# Altium integrated library Mylib Rev 4.IntLib: 207 symbols (part 2 of 3)
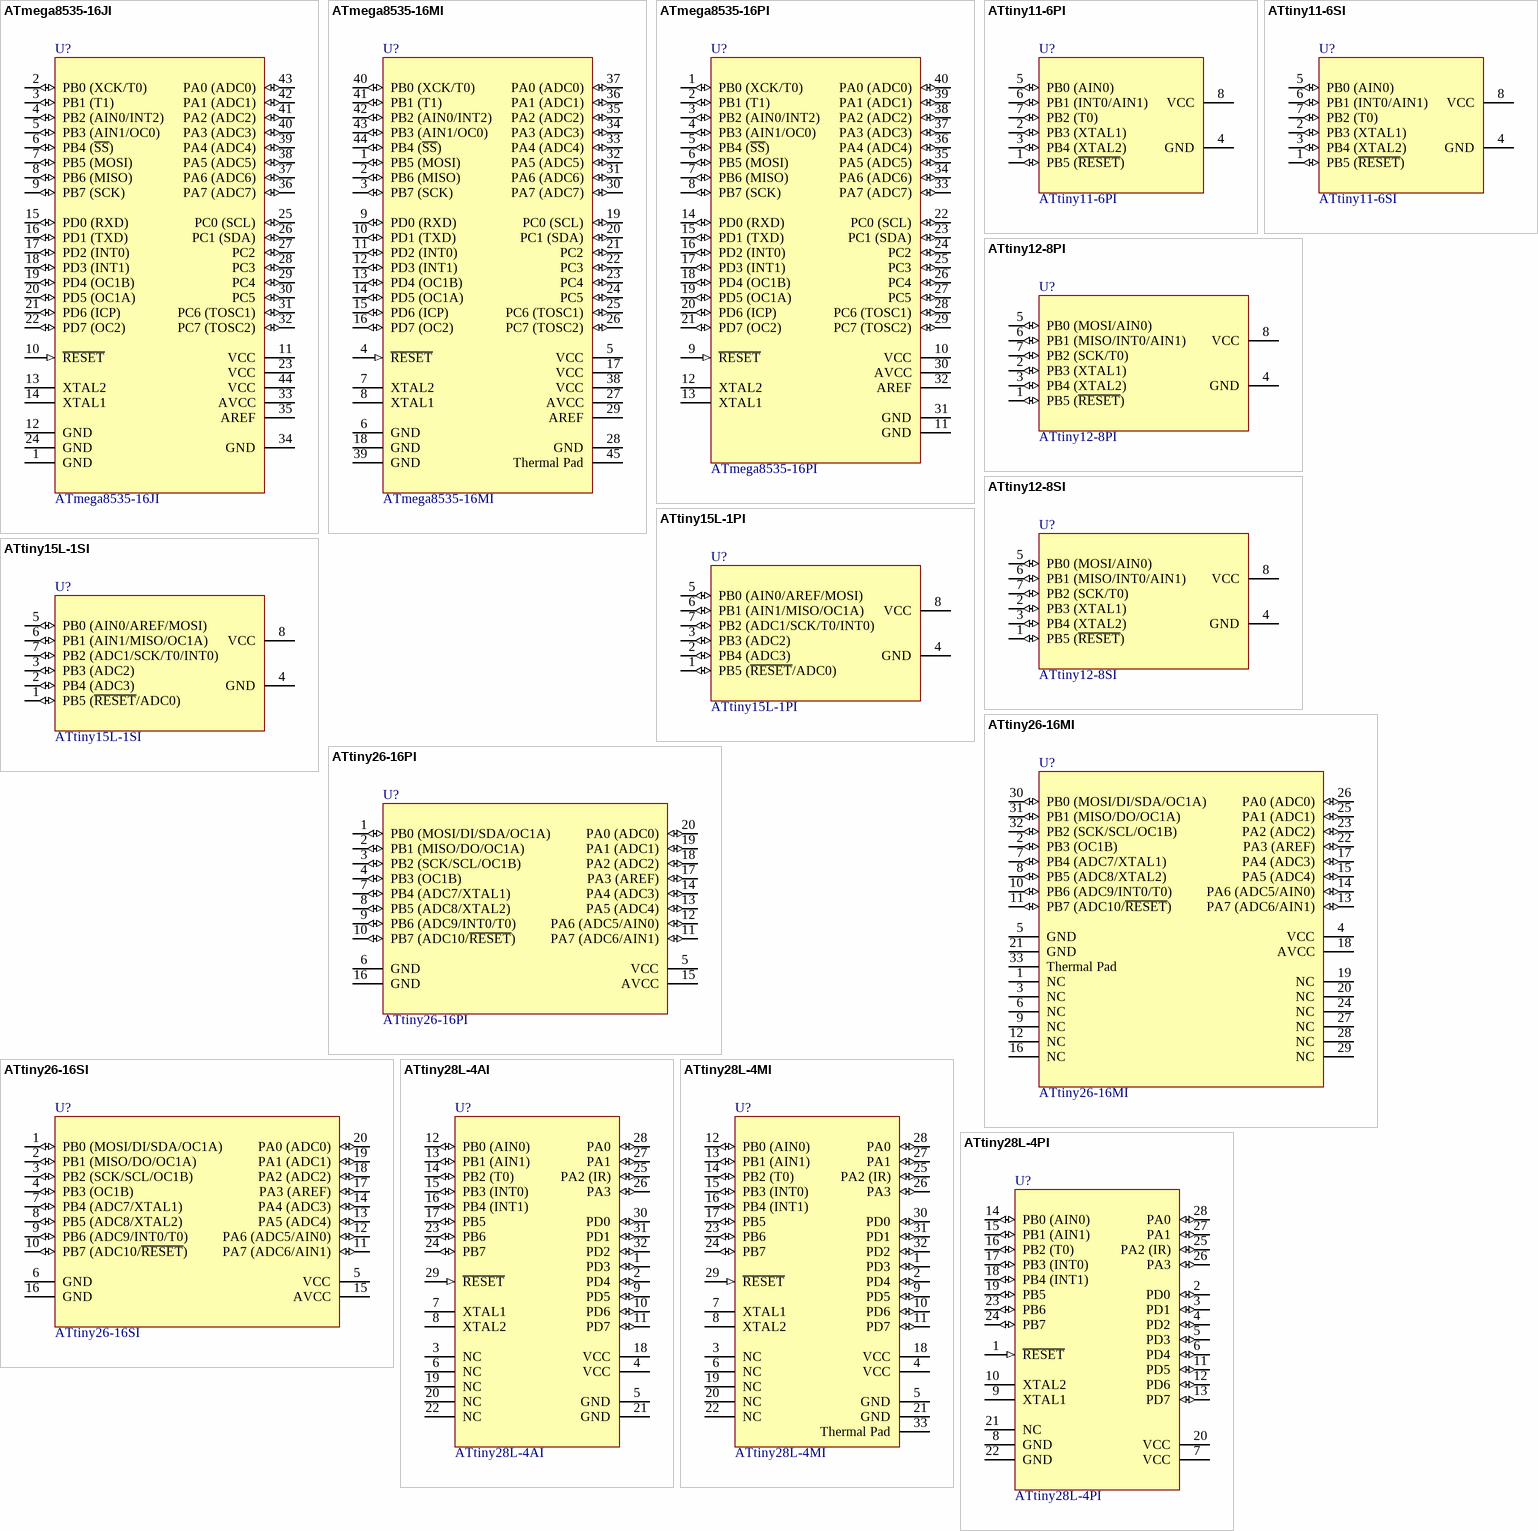
[diagram p18: symbols ATmega8535-16JI to ATtiny28L-4PI]

## ATtiny26-16SI
designator U?
AVR 2K Bytes of Flash Memory; ASiD Part Number: ATtiny26-16SI-AS
footprint My_SOP20
pins: 1 PB0 (MOSI/DI/SDA/OC1A) (io), 2 PB1 (MISO/DO/OC1A) (io), 3 PB2 (SCK/SCL/OC1B) (io), 4 PB3 (OC1B) (io), 5 VCC (power), 6 GND (power), 7 PB4 (ADC7/XTAL1) (io), 8 PB5 (ADC8/XTAL2) (io), 9 PB6 (ADC9/INT0/T0) (io), 10 PB7 (ADC10/~{RESET}) (io), 11 PA7 (ADC6/AIN1) (io), 12 PA6 (ADC5/AIN0) (io), 13 PA5 (ADC4) (io), 14 PA4 (ADC3) (io), 15 AVCC (power), 16 GND (power), 17 PA3 (AREF) (io), 18 PA2 (ADC2) (io), 19 PA1 (ADC1) (io), 20 PA0 (ADC0) (io)

## ATtiny28L-4AI
designator U?
AVR 2K Bytes of Flash Memory; ASiD Part Number: ATtiny28L-4AI-AS
footprint My_TQFP32
pins: 1 PD3 (io), 2 PD4 (io), 3 NC, 4 VCC (power), 5 GND (power), 6 NC, 7 XTAL1, 8 XTAL2, 9 PD5 (io), 10 PD6 (io), 11 PD7 (io), 12 PB0 (AIN0) (io), 13 PB1 (AIN1) (io), 14 PB2 (T0) (io), 15 PB3 (INT0) (io), 16 PB4 (INT1) (io), 17 PB5 (io), 18 VCC (power), 19 NC, 20 NC, 21 GND (power), 22 NC, 23 PB6 (io), 24 PB7 (io), 25 PA2 (IR) (io), 26 PA3 (io), 27 PA1 (io), 28 PA0 (io), 29 ~{RESET} (in), 30 PD0 (io), 31 PD1 (io), 32 PD2 (io)

## ATtiny28L-4MI
designator U?
AVR 2K Bytes of Flash Memory; ASiD Part Number: ATtiny28L-4MI-AS
footprint MY_QFN32
pins: 1 PD3 (io), 2 PD4 (io), 3 NC, 4 VCC (power), 5 GND (power), 6 NC, 7 XTAL1, 8 XTAL2, 9 PD5 (io), 10 PD6 (io), 11 PD7 (io), 12 PB0 (AIN0) (io), 13 PB1 (AIN1) (io), 14 PB2 (T0) (io), 15 PB3 (INT0) (io), 16 PB4 (INT1) (io), 17 PB5 (io), 18 VCC (power), 19 NC, 20 NC, 21 GND (power), 22 NC, 23 PB6 (io), 24 PB7 (io), 25 PA2 (IR) (io), 26 PA3 (io), 27 PA1 (io), 28 PA0 (io), 29 ~{RESET} (in), 30 PD0 (io), 31 PD1 (io), 32 PD2 (io), 33 Thermal Pad (power)

## ATtiny28L-4PI
designator U?
AVR 2K Bytes of Flash Memory; ASiD Part Number: ATtiny28L-4PI-AS
footprint My_DIP28_300
pins: 1 ~{RESET} (in), 2 PD0 (io), 3 PD1 (io), 4 PD2 (io), 5 PD3 (io), 6 PD4 (io), 7 VCC (power), 8 GND (power), 9 XTAL1, 10 XTAL2, 11 PD5 (io), 12 PD6 (io), 13 PD7 (io), 14 PB0 (AIN0) (io), 15 PB1 (AIN1) (io), 16 PB2 (T0) (io), 17 PB3 (INT0) (io), 18 PB4 (INT1) (io), 19 PB5 (io), 20 VCC (power), 21 NC, 22 GND (power), 23 PB6 (io), 24 PB7 (io), 25 PA2 (IR) (io), 26 PA3 (io), 27 PA1 (io), 28 PA0 (io)

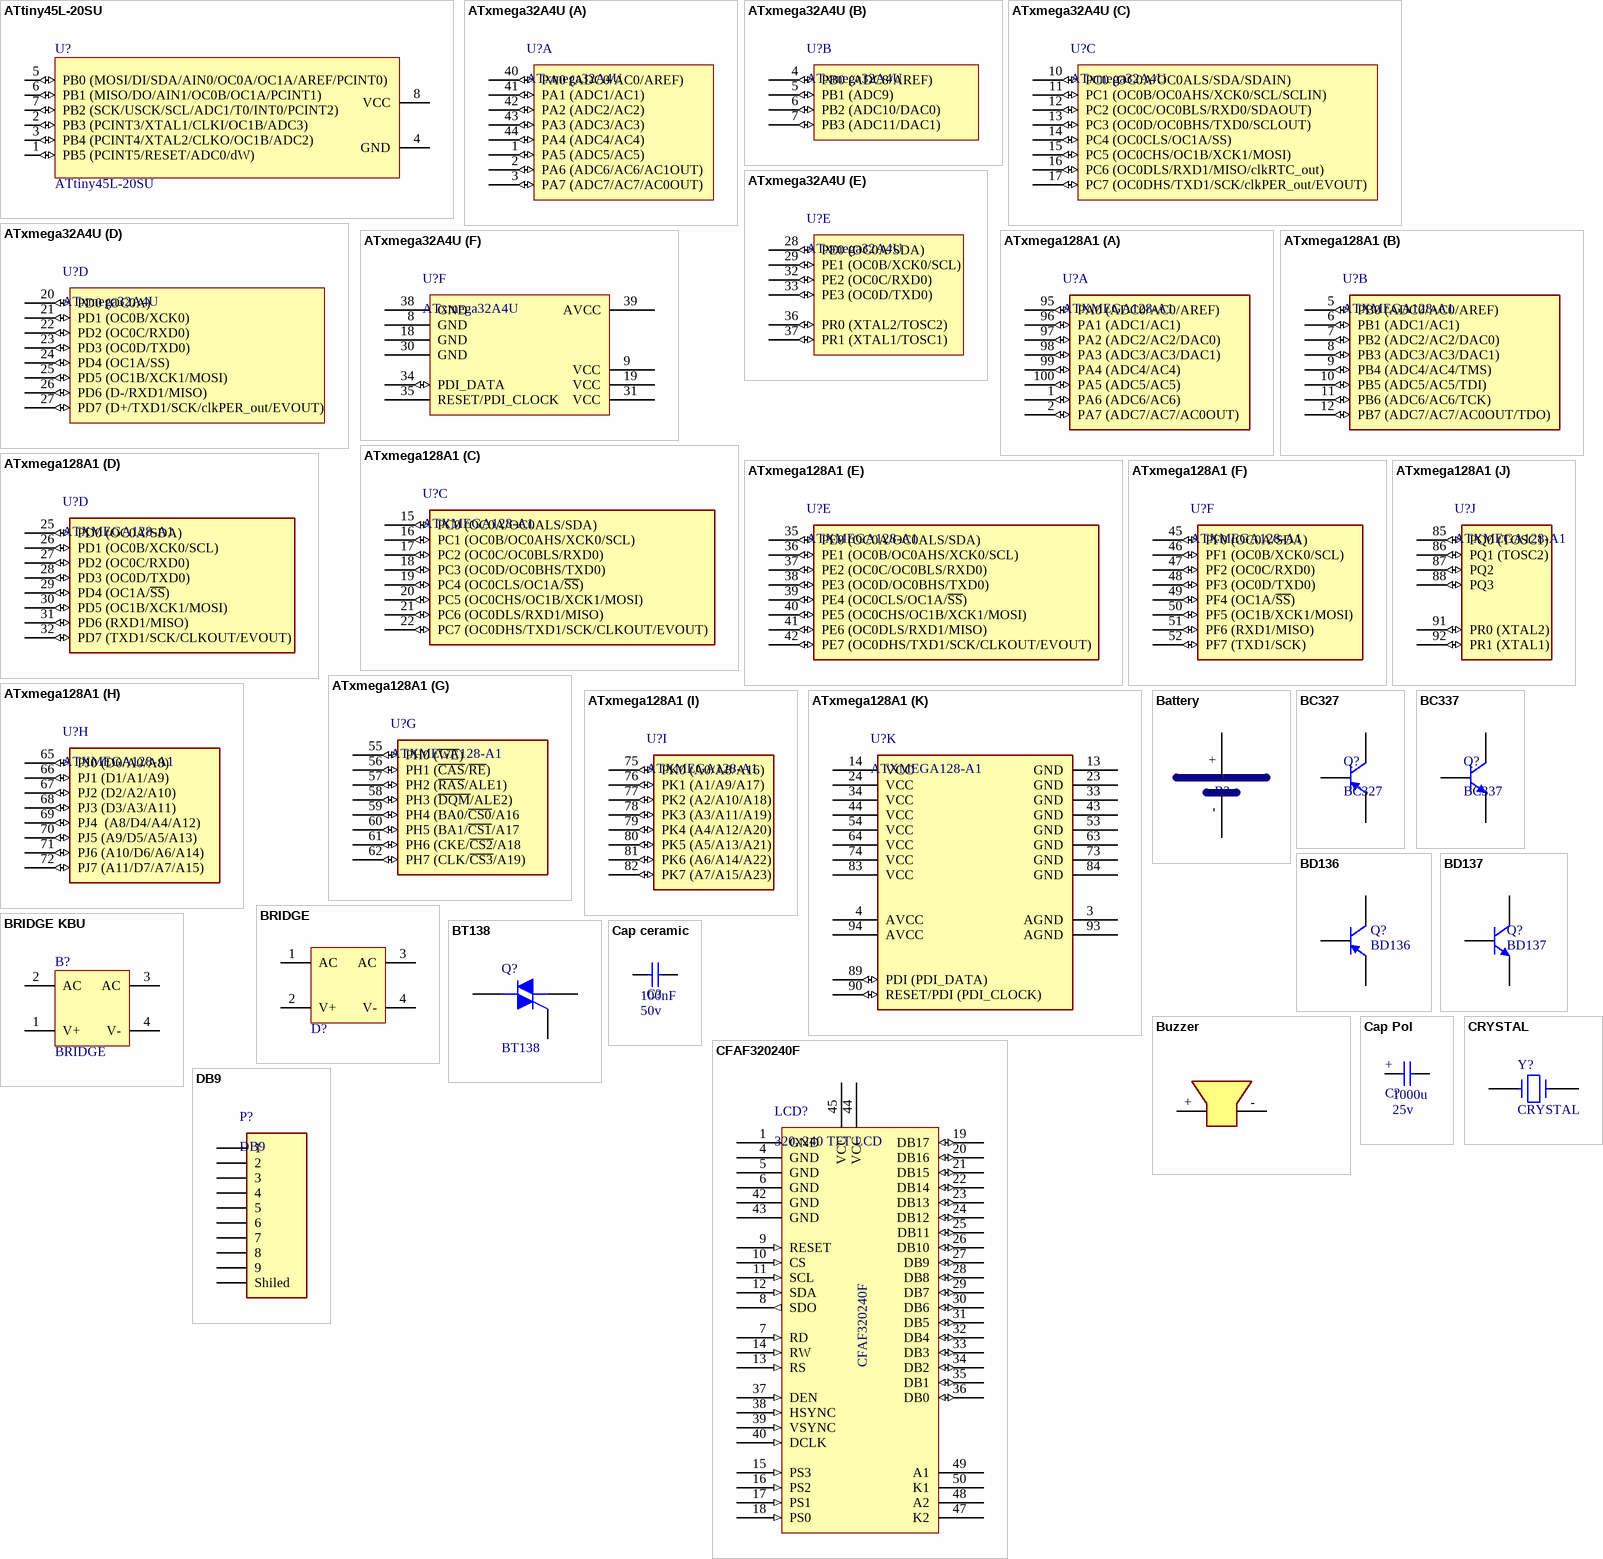
[diagram p8: symbols ATtiny45L-20SU to DB9]

## ATtiny45L-20SU
designator U?
AVR 4K Bytes of In-System Programmable Flash Memory; ASiD Part Number: ATtiny45L-20SU-AS
footprint My_SOIC_P8 (SOIC, 8-Leads, Body 5.3x5.2mm (max), Pitch 1.27mm, IPC Medium Density)
pins: 1 PB5 (PCINT5/RESET/ADC0/dW)  (io), 2 PB3 (PCINT3/XTAL1/CLKI/OC1B/ADC3)  (io), 3 PB4 (PCINT4/XTAL2/CLKO/OC1B/ADC2)  (io), 4 GND (power), 5 PB0 (MOSI/DI/SDA/AIN0/OC0A/OC1A/AREF/PCINT0) (io), 6 PB1 (MISO/DO/AIN1/OC0B/OC1A/PCINT1) (io), 7 PB2 (SCK/USCK/SCL/ADC1/T0/INT0/PCINT2) (io), 8 VCC (power)

## ATxmega32A4U
designator U?
8/16-bit Atmel XMEGA Microcontroller; ASiD Part Number: ATxmega32A4U-AS
footprint MY_LQFP44
part A pins: 1 PA5 (ADC5/AC5) (io), 2 PA6 (ADC6/AC6/AC1OUT) (io), 3 PA7 (ADC7/AC7/AC0OUT) (io), 40 PA0 (ADC0/AC0/AREF) (io), 41 PA1 (ADC1/AC1) (io), 42 PA2 (ADC2/AC2) (io), 43 PA3 (ADC3/AC3) (io), 44 PA4 (ADC4/AC4) (io)
part B pins: 4 PB0 (ADC8/AREF) (io), 5 PB1 (ADC9) (io), 6 PB2 (ADC10/DAC0) (io), 7 PB3 (ADC11/DAC1) (io)
part C pins: 10 PC0 (OC0A/OC0ALS/SDA/SDAIN) (io), 11 PC1 (OC0B/OC0AHS/XCK0/SCL/SCLIN) (io), 12 PC2 (OC0C/OC0BLS/RXD0/SDAOUT) (io), 13 PC3 (OC0D/OC0BHS/TXD0/SCLOUT) (io), 14 PC4 (OC0CLS/OC1A/SS) (io), 15 PC5 (OC0CHS/OC1B/XCK1/MOSI) (io), 16 PC6 (OC0DLS/RXD1/MISO/clkRTC_out) (io), 17 PC7 (OC0DHS/TXD1/SCK/clkPER_out/EVOUT) (io)
part D pins: 20 PD0 (OC0A) (io), 21 PD1 (OC0B/XCK0) (io), 22 PD2 (OC0C/RXD0) (io), 23 PD3 (OC0D/TXD0) (io), 24 PD4 (OC1A/SS) (io), 25 PD5 (OC1B/XCK1/MOSI) (io), 26 PD6 (D-/RXD1/MISO) (io), 27 PD7 (D+/TXD1/SCK/clkPER_out/EVOUT) (io)
part E pins: 28 PE0 (OC0A/SDA) (io), 29 PE1 (OC0B/XCK0/SCL) (io), 32 PE2 (OC0C/RXD0) (io), 33 PE3 (OC0D/TXD0) (io), 36 PR0 (XTAL2/TOSC2) (io), 37 PR1 (XTAL1/TOSC1) (io)
part F pins: 8 GND (power), 9 VCC (power), 18 GND (power), 19 VCC (power), 30 GND (power), 31 VCC (power), 34 PDI_DATA (io), 35 RESET/PDI_CLOCK, 38 GND (power), 39 AVCC (power)

## ATxmega128A1
designator U?, comment ATXMEGA128-A1
AVR XMEGA Microcontroller; ASiD Part Number: ATXMEGA128-A1-AS
footprint MY_TQFP100
part A pins: 1 PA6 (ADC6/AC6) (io), 2 PA7 (ADC7/AC7/AC0OUT) (io), 95 PA0 (ADC0/AC0/AREF) (io), 96 PA1 (ADC1/AC1) (io), 97 PA2 (ADC2/AC2/DAC0) (io), 98 PA3 (ADC3/AC3/DAC1) (io), 99 PA4 (ADC4/AC4) (io), 100 PA5 (ADC5/AC5) (io)
part B pins: 5 PB0 (ADC0/AC0/AREF) (io), 6 PB1 (ADC1/AC1) (io), 7 PB2 (ADC2/AC2/DAC0) (io), 8 PB3 (ADC3/AC3/DAC1) (io), 9 PB4 (ADC4/AC4/TMS) (io), 10 PB5 (ADC5/AC5/TDI) (io), 11 PB6 (ADC6/AC6/TCK) (io), 12 PB7 (ADC7/AC7/AC0OUT/TDO) (io)
part C pins: 15 PC0 (OC0A/OC0ALS/SDA) (io), 16 PC1 (OC0B/OC0AHS/XCK0/SCL) (io), 17 PC2 (OC0C/OC0BLS/RXD0) (io), 18 PC3 (OC0D/OC0BHS/TXD0) (io), 19 PC4 (OC0CLS/OC1A/~{SS}) (io), 20 PC5 (OC0CHS/OC1B/XCK1/MOSI) (io), 21 PC6 (OC0DLS/RXD1/MISO) (io), 22 PC7 (OC0DHS/TXD1/SCK/CLKOUT/EVOUT) (io)
part D pins: 25 PD0 (OC0A/SDA) (io), 26 PD1 (OC0B/XCK0/SCL) (io), 27 PD2 (OC0C/RXD0) (io), 28 PD3 (OC0D/TXD0) (io), 29 PD4 (OC1A/~{SS}) (io), 30 PD5 (OC1B/XCK1/MOSI) (io), 31 PD6 (RXD1/MISO) (io), 32 PD7 (TXD1/SCK/CLKOUT/EVOUT) (io)
part E pins: 35 PE0 (OC0A/OC0ALS/SDA) (io), 36 PE1 (OC0B/OC0AHS/XCK0/SCL) (io), 37 PE2 (OC0C/OC0BLS/RXD0) (io), 38 PE3 (OC0D/OC0BHS/TXD0) (io), 39 PE4 (OC0CLS/OC1A/~{SS}) (io), 40 PE5 (OC0CHS/OC1B/XCK1/MOSI) (io), 41 PE6 (OC0DLS/RXD1/MISO) (io), 42 PE7 (OC0DHS/TXD1/SCK/CLKOUT/EVOUT) (io)
part F pins: 45 PF0 (OC0A/SDA) (io), 46 PF1 (OC0B/XCK0/SCL) (io), 47 PF2 (OC0C/RXD0) (io), 48 PF3 (OC0D/TXD0) (io), 49 PF4 (OC1A/~{SS}) (io), 50 PF5 (OC1B/XCK1/MOSI) (io), 51 PF6 (RXD1/MISO) (io), 52 PF7 (TXD1/SCK) (io)
part G pins: 55 PH0 (~{WE}) (io), 56 PH1 (~{CAS}/~{RE}) (io), 57 PH2 (~{RAS}/ALE1) (io), 58 PH3 (~{DQM}/ALE2) (io), 59 PH4 (BA0/~{CS0}/A16 (io), 60 PH5 (BA1/~{CS1}/A17 (io), 61 PH6 (CKE/~{CS2}/A18 (io), 62 PH7 (CLK/~{CS3}/A19) (io)
part H pins: 65 PJ0 (D0/A0/A8) (io), 66 PJ1 (D1/A1/A9) (io), 67 PJ2 (D2/A2/A10) (io), 68 PJ3 (D3/A3/A11) (io), 69 PJ4  (A8/D4/A4/A12) (io), 70 PJ5 (A9/D5/A5/A13) (io), 71 PJ6 (A10/D6/A6/A14) (io), 72 PJ7 (A11/D7/A7/A15) (io)
part I pins: 75 PK0 (A0/A8/A16) (io), 76 PK1 (A1/A9/A17) (io), 77 PK2 (A2/A10/A18) (io), 78 PK3 (A3/A11/A19) (io), 79 PK4 (A4/A12/A20) (io), 80 PK5 (A5/A13/A21) (io), 81 PK6 (A6/A14/A22) (io), 82 PK7 (A7/A15/A23) (io)
part J pins: 85 PQ0 (TOSC1) (io), 86 PQ1 (TOSC2) (io), 87 PQ2 (io), 88 PQ3 (io), 91 PR0 (XTAL2) (io), 92 PR1 (XTAL1) (io)
part K pins: 3 AGND (power), 4 AVCC (power), 13 GND (power), 14 VCC (power), 23 GND (power), 24 VCC (power), 33 GND (power), 34 VCC (power), 43 GND (power), 44 VCC (power), 53 GND (power), 54 VCC (power), 63 GND (power), 64 VCC (power), 73 GND (power), 74 VCC (power), 83 VCC (power), 84 GND (power), 89 PDI (PDI_DATA) (io), 90 RESET/PDI (PDI_CLOCK) (io), 93 AGND (power), 94 AVCC (power)

## Battery
designator B?, comment Littium Battery  (value not drawn)
3V PC Littium Battery
footprint MY_RTC BAT SMD (RTC BAT SMD)
pins: 0 hidden, +, -

## BC327
designator Q?
Transistor; ASiD Part Number: BC327-AS
footprint MY_TO92
pins: 1 E, 2 B, 3 C

## BC337
designator Q?
Transistor; ASiD Part Number: BC337-AS
footprint MY_TO92
pins: 1 E, 2 B, 3 C

## BD136
designator Q?
Darlington transistor; ASiD Part Number: BD136-AS
footprint My_TO126
pins: B, C, E

## BD137
designator Q?
Darlington transistor; ASiD Part Number: BD137-AS
footprint My_TO126
pins: B, C, E

## BRIDGE
designator D?  (value not drawn)
Diode Bridge 1 Amp; ASiD Part Number: BRIDGE-AS
footprint My_bridg
pins: 1 AC, 2 V+, 3 AC, 4 V-

## BRIDGE KBU
designator B?, comment BRIDGE
BRIDGE KBU 6 Amp; ASiD Part Number: BRIDGE KBU-AS
footprint My_KBU
pins: 1 V+ (power), 2 AC, 3 AC, 4 V- (power)

## BT138
designator Q?
Silicon Bidirectional Triode Thyristor; ASiD Part Number: BT138-AS
footprint My_TO220
footprint MY_TO220V_heatsink
pins: 1 M1, 2 M2, 3 G

## Buzzer
designator U?, comment Buzzer small
5-12v small buzzer (12mm); ASiD Part Number: Buzzer small-AS
footprint My_Buzzer
pins: + 1 (power), - 2 (power)

## Cap ceramic
designator C?, comment Volte: 50v  (hidden comment: 100nF)
None polar capacitor; ASiD Part Number: C-AS; Value: 100nF
footprint My_cap100n
footprint MY_1206
footprint MY_0805
footprint MY_1210
footprint MY_1310
footprint MY_1608
footprint MY_1812
footprint MY_1825
footprint MY_2012
footprint MY_2220
footprint MY_2225
footprint MY_3216
footprint MY_3225
footprint MY_4532
footprint MY_4564
footprint MY_0201
footprint MY_0402
footprint MY_0603
footprint MY_E5-7.5mm
footprint MY_E6-10mm
footprint MY_E8.4-15mm
footprint MY_2010
footprint MY_1218
footprint MY_E5-7.5mmB
footprint MY_E8.7-26.8mm
footprint MY_E9.3-31.6mm
footprint MY_E3.2-10.3mm
footprint MY_2512 (R2512)
pins: 1, 2

## Cap Pol
designator C?, comment Volte: 25v  (hidden comment: 1000u)
Polar capacitor; ASiD Part Number: C-AS; Value: 1000u
footprint MY_E2.5-5mm
footprint MY_E2.5-6mm
footprint MY_E2.5-7mm
footprint MY_E3.5-8mm
footprint MY_E3.5-10mm
footprint MY_E5-13mm
footprint MY_E7.5-16mm
footprint MY_E7.5-18mm
footprint MY_E10-35mm
footprint MY_CLV_1012
footprint MY_CLV_0405
footprint MY_CLV_0605
footprint MY_CLV_0810
footprint MY_E5-10.5mm
footprint MY_CLV_0505
footprint MY_SMC_A
footprint MY_SMC_B
footprint MY_SMC_C
footprint MY_SMC_D
footprint MY_SMC_E
pins: +, -

## CFAF320240F
designator LCD?, comment 320x240 TFT LCD
ASiD Part Number: TS8002F-AS
footprint MY_FPC50
footprint MY_CFAF320240F
pins: 1 GND (power), 4 GND (power), 5 GND (power), 6 GND (power), 7 RD (in), 8 SDO (out), 9 RESET (in), 10 CS (in), 11 SCL (in), 12 SDA (in), 13 RS (in), 14 RW (in), 15 PS3 (in), 16 PS2 (in), 17 PS1 (in), 18 PS0 (in), 19 DB17 (io), 20 DB16 (io), 21 DB15 (io), 22 DB14 (io), 23 DB13 (io), 24 DB12 (io), 25 DB11 (io), 26 DB10 (io), 27 DB9 (io), 28 DB8 (io), 29 DB7 (io), 30 DB6 (io), 31 DB5 (io), 32 DB4 (io), 33 DB3 (io), 34 DB2 (io), 35 DB1 (io), 36 DB0 (io), 37 DEN (in), 38 HSYNC (in), 39 VSYNC (in), 40 DCLK (in), 42 GND (power), 43 GND (power), 44 VCC (power), 45 VCC (power), 47 K2, 48 A2, 49 A1, 50 K1

## CRYSTAL
designator Y?
ASiD Part Number: Crystal-AS
footprint My_Crystal
footprint MY_RTC_Crystal
footprint My_Crystal_SMD
footprint My_Crystal_2
pins: 1, 2

## DB9
designator P?
DB9 (Right angle  PCB mount); ASiD Part Number: DB9-AS
footprint MY_DSUB9_Female (Connector; D Subminiature; 9 Position; Right Angle; Pitch 1.385 mm)
footprint MY_DSUB9_Male
pins: 1, 2, 3, 4, 5, 6, 7, 8, 9, 10 Shiled

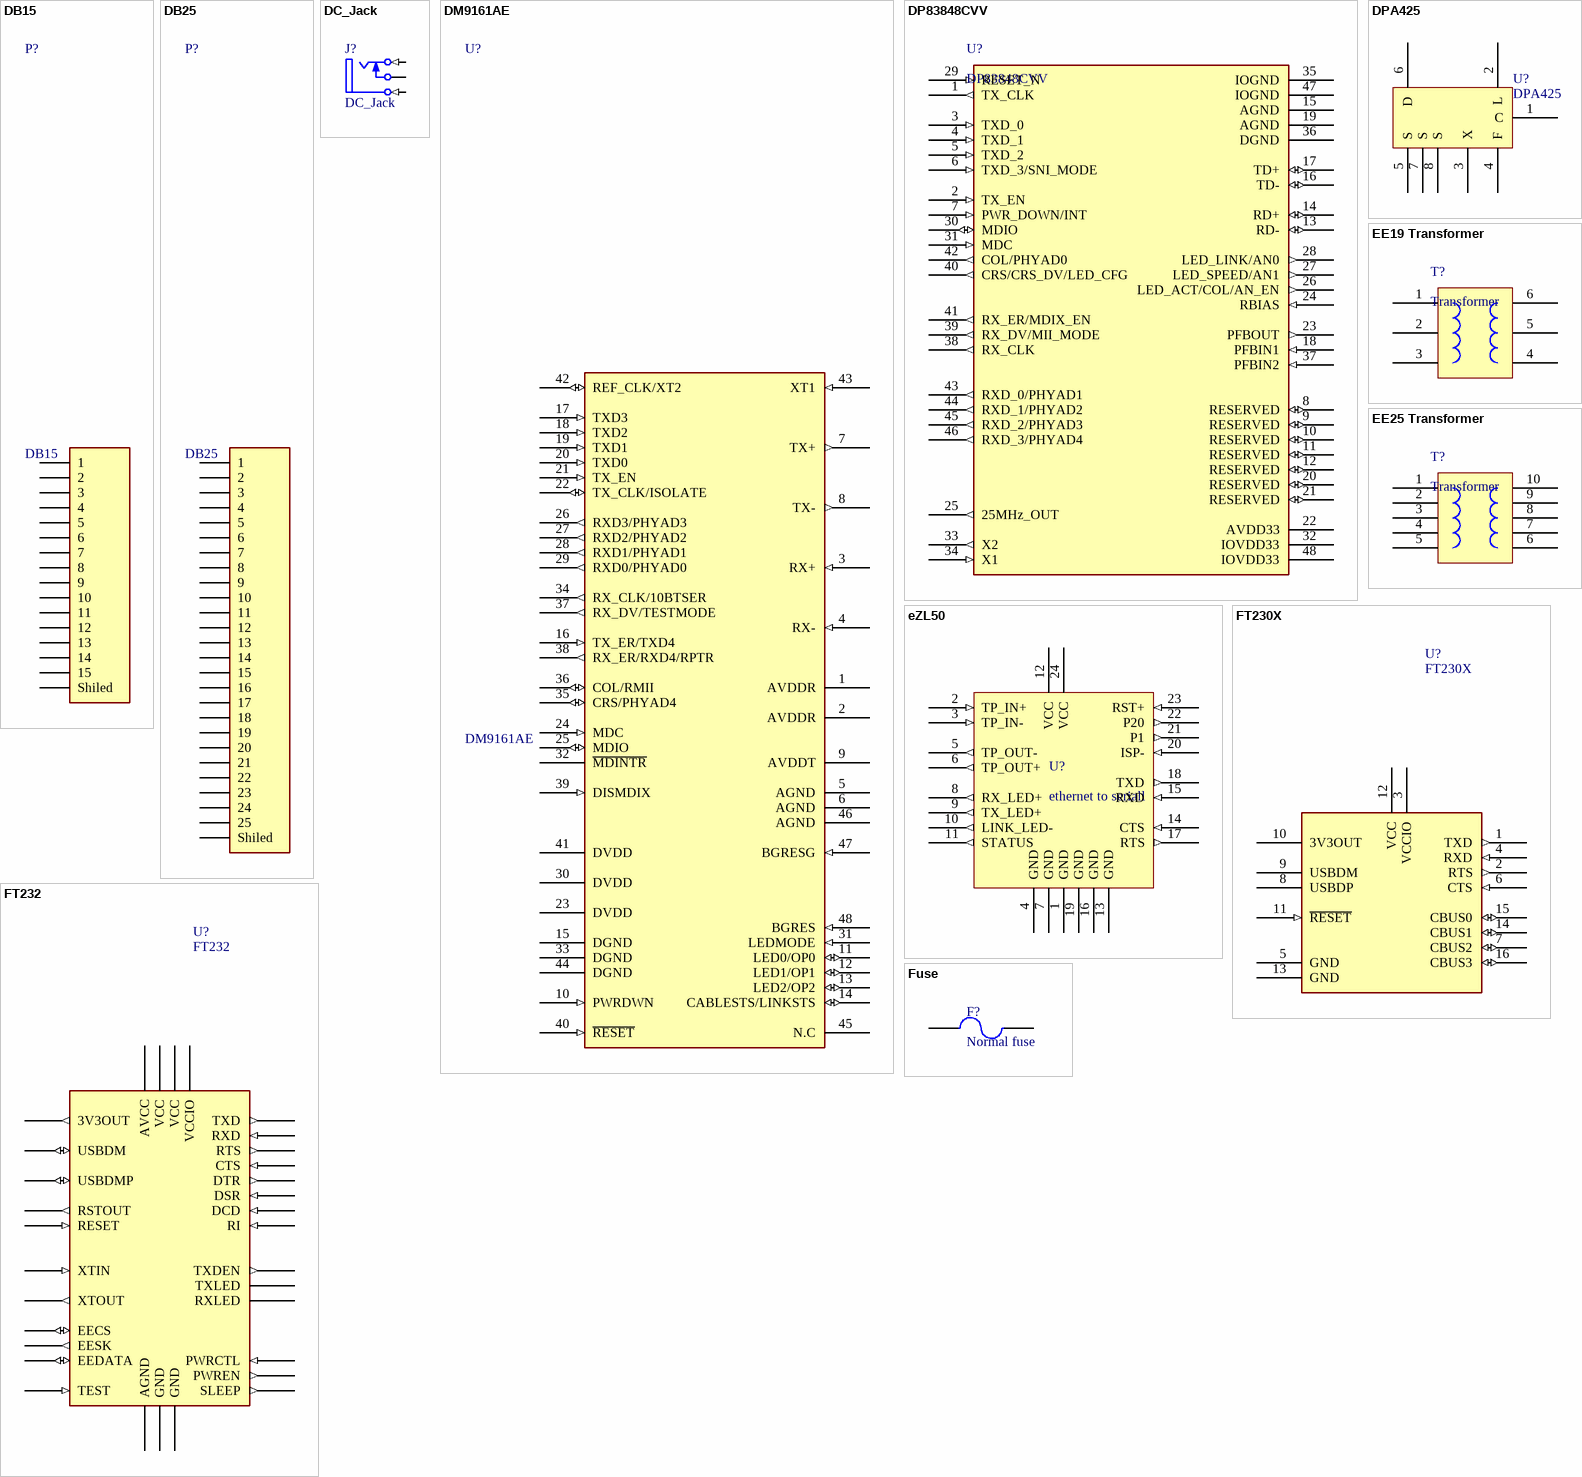
[diagram p9: symbols DB15 to Fuse]

## DB15
designator P?
DB15 (Right angle  PCB mount); ASiD Part Number: DB15-AS
footprint MY_DSUB15_Female (Connector; D Subminiature; 15 Position; Right Angle; Pitch 1.385 mm)
footprint MY_DSUB15_Male
pins: 1, 2, 3, 4, 5, 6, 7, 8, 9, 10, 11, 12, 13, 14, 15, 16 Shiled

## DB25
designator P?
DB25 (Right angle  PCB mount); ASiD Part Number: DB25-AS
footprint MY_DSUB25_Female (Connector; D Subminiature; 25 Position; Right Angle; Pitch 1.385 mm)
footprint MY_DSUB25_Male
pins: 1, 2, 3, 4, 5, 6, 7, 8, 9, 10, 11, 12, 13, 14, 15, 16, 17, 18, 19, 20, 21, 22, 23, 24, 25, 26 Shiled

## DC_Jack
designator J?
ASiD Part Number: DC_Jack-AS
footprint My_DC_Jack
signal-integrity model JACK Socket
pins: 1 T (in) "Tip", 2 TN "Tip Normal (Break Contact)", 3 S (in) "Sleeve (Ground)"

## DM9161AE
designator U?
Ethernet PHY; ASiD Part Number: DM9161AE-AS
footprint MY_LQFP48 (TSQFP, 48-Leads, Body 9.0x9.0mm (max), Pitch 0.50mm, IPC Medium Density)
pins: 1 AVDDR (power), 2 AVDDR (power), 3 RX+ (in), 4 RX- (in), 5 AGND (power), 6 AGND (power), 7 TX+ (out), 8 TX- (out), 9 AVDDT (power), 10 PWRDWN (in), 11 LED0/OP0 (io), 12 LED1/OP1 (io), 13 LED2/OP2 (io), 14 CABLESTS/LINKSTS (io), 15 DGND (power), 16 TX_ER/TXD4 (in), 17 TXD3 (in), 18 TXD2 (in), 19 TXD1 (in), 20 TXD0 (in), 21 TX_EN (in), 22 TX_CLK/ISOLATE (io), 23 DVDD (power), 24 MDC (in), 25 MDIO (io), 26 RXD3/PHYAD3 (out), 27 RXD2/PHYAD2 (out), 28 RXD1/PHYAD1 (out), 29 RXD0/PHYAD0 (out), 30 DVDD (power), 31 LEDMODE (in), 32 ~{MDINTR} (hiz), 33 DGND (power), 34 RX_CLK/10BTSER (out), 35 CRS/PHYAD4 (io), 36 COL/RMII (io), 37 RX_DV/TESTMODE (out), 38 RX_ER/RXD4/RPTR (out), 39 DISMDIX (in), 40 ~{RESET} (in), 41 DVDD (power), 42 REF_CLK/XT2 (io), 43 XT1 (in), 44 DGND (power), 45 N.C, 46 AGND (power), 47 BGRESG (in), 48 BGRES (in)

## DP83848CVV
designator U?
Commercial Temperature Single Port 10/100 Mb/s Ethernet  Physical Layer Transceiver; ASiD Part Number: DP83848CVV-AS
footprint MY_LQFP48 (TSQFP, 48-Leads, Body 9.0x9.0mm (max), Pitch 0.50mm, IPC Medium Density)
pins: 1 TX_CLK (out), 2 TX_EN (in), 3 TXD_0 (in), 4 TXD_1 (in), 5 TXD_2 (in), 6 TXD_3/SNI_MODE (in), 7 PWR_DOWN/INT (in), 8 RESERVED (io), 9 RESERVED (io), 10 RESERVED (io), 11 RESERVED (io), 12 RESERVED (io), 13 RD- (io), 14 RD+ (io), 15 AGND (power), 16 TD- (io), 17 TD+ (io), 18 PFBIN1 (in), 19 AGND (power), 20 RESERVED (io), 21 RESERVED (io), 22 AVDD33 (power), 23 PFBOUT (out), 24 RBIAS (in), 25 25MHz_OUT (out), 26 LED_ACT/COL/AN_EN (out), 27 LED_SPEED/AN1 (out), 28 LED_LINK/AN0 (out), 29 RESET_N (in), 30 MDIO (io), 31 MDC (in), 32 IOVDD33 (power), 33 X2 (out), 34 X1 (in), 35 IOGND (power), 36 DGND (power), 37 PFBIN2 (in), 38 RX_CLK (out), 39 RX_DV/MII_MODE (out), 40 CRS/CRS_DV/LED_CFG (out), 41 RX_ER/MDIX_EN (out), 42 COL/PHYAD0 (out), 43 RXD_0/PHYAD1 (out), 44 RXD_1/PHYAD2 (out), 45 RXD_2/PHYAD3 (out), 46 RXD_3/PHYAD4 (out), 47 IOGND (power), 48 IOVDD33 (power)

## DPA425
designator U?
Highly Integrated DC-DC Converter ICs for  Power over Ethernet & Telecom Applications; ASiD Part Number: DPA425-AS
footprint My_SOIC_DPA
footprint My_DIP8
pins: 1 C, 2 L, 3 X, 4 F, 5 S, 6 D, 7 S, 8 S

## EE19 Transformer
designator T?, comment Transformer
Standard EE19 6 pin Transformer; ASiD Part Number: EE19 Transformer-AS
footprint MY_EE19
pins: 1, 2, 3, 4, 5, 6

## EE25 Transformer
designator T?, comment Transformer
Standard EE25 10 pin Transformer; ASiD Part Number: EE25 Transformer-AS
footprint MY_EE25_10
footprint MY_EE19_10
pins: 1, 2, 3, 4, 5, 6, 7, 8, 9, 10

## eZL50
designator U?, comment ethernet to seriall
ASiD Part Number: eZL50-AS
footprint MY_eZL50
pins: 1 GND (power), 2 TP_IN+ (in), 3 TP_IN- (in), 4 GND (power), 5 TP_OUT- (out), 6 TP_OUT+ (out), 7 GND (power), 8 RX_LED+ (out), 9 TX_LED+ (out), 10 LINK_LED- (out), 11 STATUS (out), 12 VCC (power), 13 GND (power), 14 CTS (in), 15 RXD (in), 16 GND (power), 17 RTS (out), 18 TXD (out), 19 GND (power), 20 ISP- (in), 21 P1 (out), 22 P20 (out), 23 RST+ (in), 24 VCC (power)

## FT230X
designator U?
USB to BASIC UART IC; ASiD Part Number: FT230X-AS
footprint MY_SSOP_16
pins: 1 TXD (out), 2 RTS (out), 3 VCCIO (power), 4 RXD (in), 5 GND (power), 6 CTS (in), 7 CBUS2 (io), 8 USBDP, 9 USBDM, 10 3V3OUT (power), 11 ~{RESET} (in), 12 VCC (power), 13 GND (power), 14 CBUS1 (io), 15 CBUS0 (io), 16 CBUS3 (io)

## FT232
designator U?
USB to RS232 Convertor; ASiD Part Number: FT232-AS
footprint My_TQFP32
pins: 1 EESK (out), 2 EEDATA (io), 3 VCC (power), 4 RESET (in), 5 RSTOUT (out), 6 3V3OUT (out), 7 USBDMP (io), 8 USBDM (io), 9 GND (power), 10 SLEEP (out), 11 RXLED (oc), 12 TXLED (oc), 13 VCCIO (power), 14 PWRCTL (in), 15 PWREN (out), 16 TXDEN (out), 17 GND (power), 18 RI (in), 19 DCD (in), 20 DSR (in), 21 DTR (out), 22 CTS (in), 23 RTS (out), 24 RXD (in), 25 TXD (out), 26 VCC (power), 27 XTIN (in), 28 XTOUT (out), 29 AGND (power), 30 AVCC (power), 31 TEST (in), 32 EECS (io)

## Fuse
designator F?, comment Normal fuse
ASiD Part Number: Fuse-AS
footprint MY_FUSE
pins: 1, 2

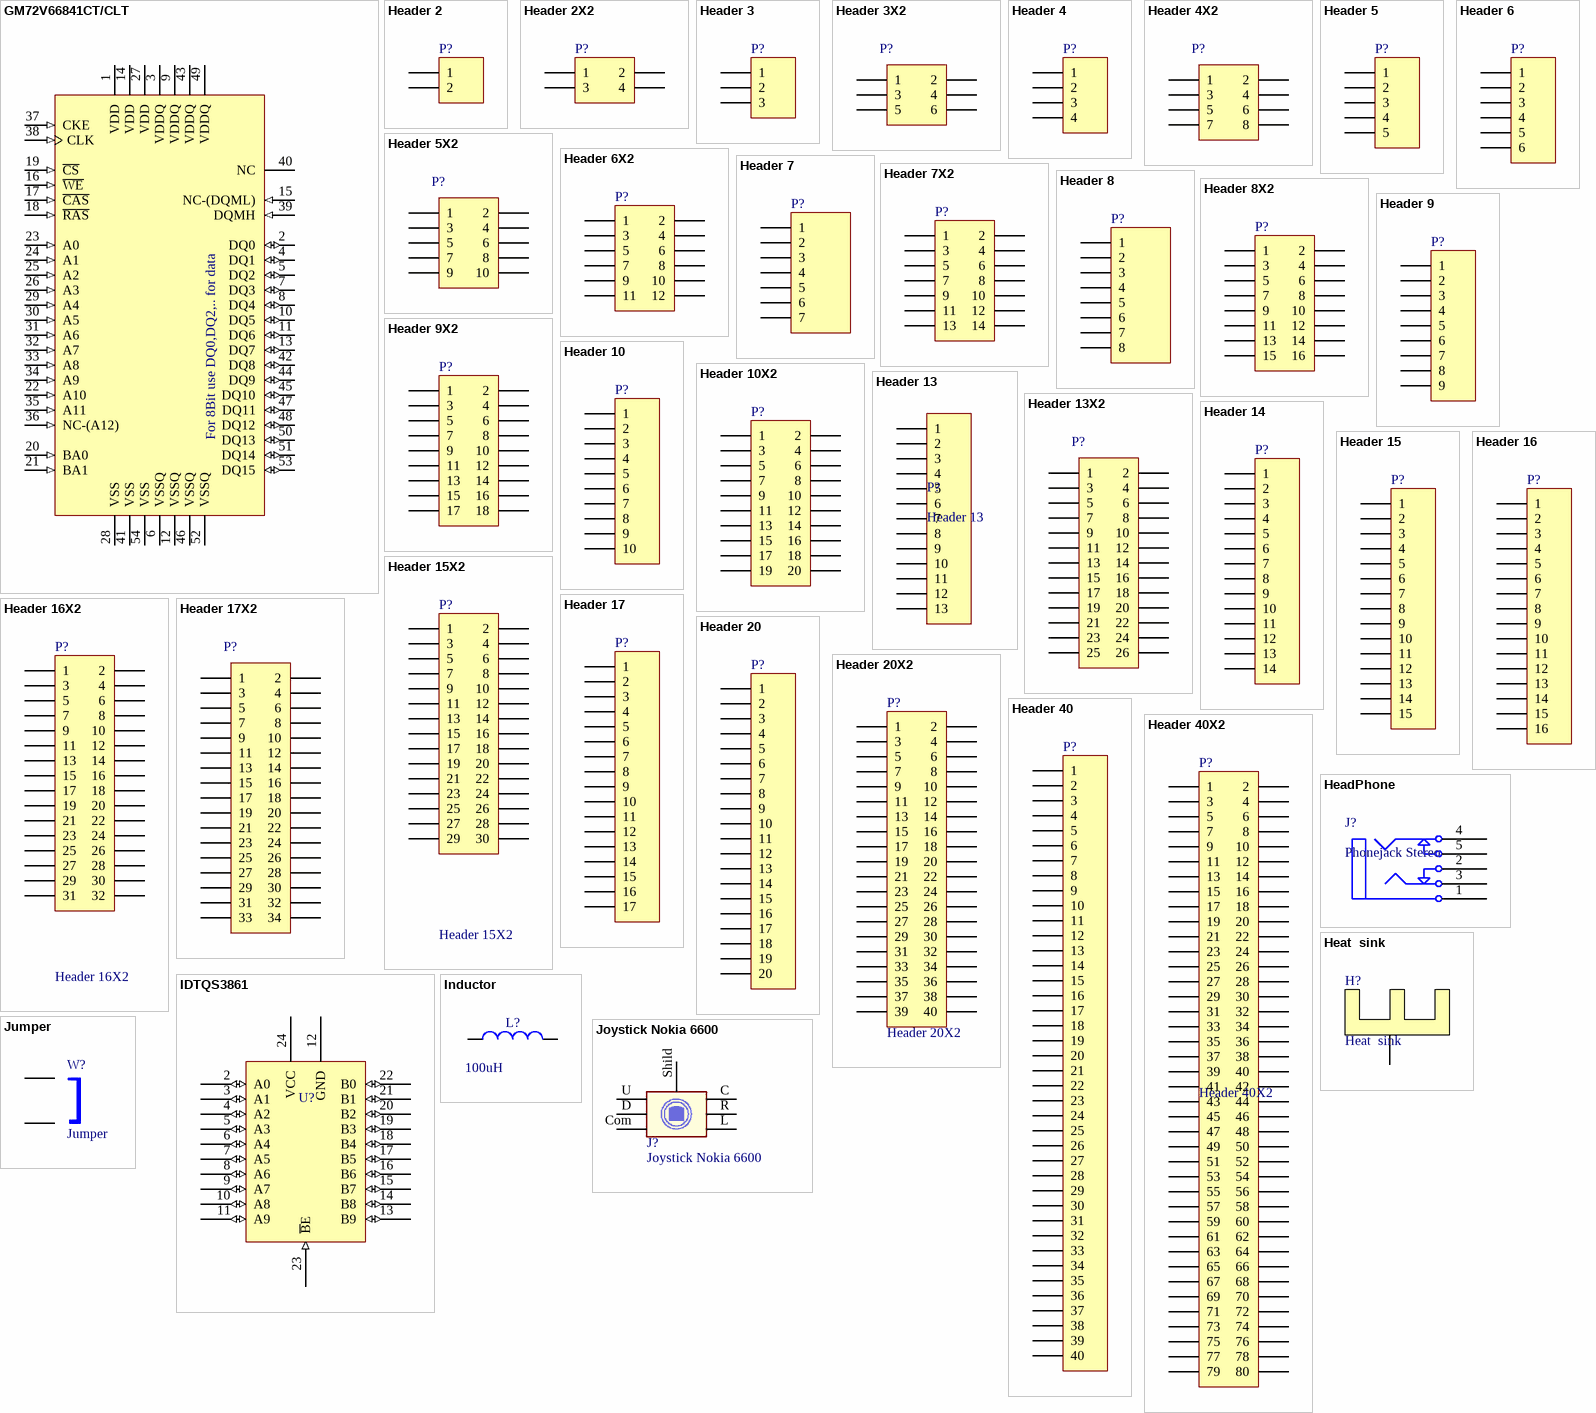
[diagram p10: symbols GM72V66841CT/CLT to Jumper]

## GM72V66841CT/CLT
designator U?
2,097,152 WORD x 8 BIT x 4 BANK  SYNCHRONOUS DYNAMIC RAM; ASiD Part Number: GM72V66841CT/CLT-AS
footprint MY_TSOP54
pins: 1 VDD (power) "Power Supply", 2 DQ0 (io) "Data Input/Output 0", 3 VDDQ (power) "DQ Power", 4 DQ1 (io) "Data Input/Output 1", 5 DQ2 (io) "Data Input/Output 2", 6 VSSQ (power) "DQ Ground", 7 DQ3 (io) "Data Input/Output 3", 8 DQ4 (io) "Data Input/Output 4", 9 VDDQ (power) "DQ Power", 10 DQ5 (io) "Data Input/Output 5", 11 DQ6 (io) "Data Input/Output 6", 12 VSSQ (power) "DQ Ground", 13 DQ7 (io) "Data Input/Output 7", 14 VDD (power) "Power Supply", 15 NC-(DQML) (in) "Input/Output Mask for DQ0-DQ7", 16 ~{WE} (in) "Command Input", 17 ~{CAS} (in) "Command Input", 18 ~{RAS} (in) "Command Input", 19 ~{CS} (in) "Chip Select", 20 BA0 (in) "Bank Address Input 0", 21 BA1 (in) "Bank Address Input 1", 22 A10 (in) "Address Input 10", 23 A0 (in) "Address Input 0", 24 A1 (in) "Address Input 1", 25 A2 (in) "Address Input 2", 26 A3 (in) "Address Input 3", 27 VDD (power) "Power Supply", 28 VSS (power) "Ground", 29 A4 (in) "Address Input 4", 30 A5 (in) "Address Input 5", 31 A6 (in) "Address Input 6", 32 A7 (in) "Address Input 7", 33 A8 (in) "Address Input 8", 34 A9 (in) "Address Input 9", 35 A11 (in) "Address Input 11", 36 NC-(A12) (in) "Address Input 12", 37 CKE (in) "Clock Enable", 38 CLK (in) "Clock", 39 DQMH (in) "Input/Output Mask for DQ8-DQ15", 40 NC "No Connect", 41 VSS (power) "Ground", 42 DQ8 (io) "Data Input/Output 8", 43 VDDQ (power) "DQ Power", 44 DQ9 (io) "Data Input/Output 9", 45 DQ10 (io) "Data Input/Output 10", 46 VSSQ (power) "DQ Ground", 47 DQ11 (io) "Data Input/Output 11", 48 DQ12 (io) "Data Input/Output 12", 49 VDDQ (power) "DQ Power", 50 DQ13 (io) "Data Input/Output 13", 51 DQ14 (io) "Data Input/Output 14", 52 VSSQ (power) "DQ Ground", 53 DQ15 (io) "Data Input/Output 15", 54 VSS (power) "Ground"
text: For 8Bit use DQ0,DQ2,.. for data

## Header 2
designator P?  (value not drawn)
Header, 2-Pin; ASiD Part Number: Header 2-AS
footprint My_1X02
signal-integrity model Connector
footprint My_ Power_Connector
footprint My_CN2
footprint MY_MSTBA2
footprint MY_power_cord
footprint MY_6410-02
footprint MY_7395-02
footprint MY_FE02
footprint MY_FE02W
footprint MY_MA02-1W
footprint MY_ECH381H_02P
pins: 1, 2

## Header 2X2
designator P?  (value not drawn)
Header, 2-Pin, Dual row; ASiD Part Number: Header 2X2-AS
footprint My_2X02
signal-integrity model Connector
footprint MY_FE02-2W
footprint MY_MA02-2W
footprint MY_FE02-2
pins: 1, 2, 3, 4

## Header 3
designator P?  (value not drawn)
Header, 3-Pin; ASiD Part Number: Header 3-AS
footprint My_1X03
signal-integrity model Connector
footprint My_CN3
footprint MY_MSTBA3
footprint MY_6410-03
footprint MY_7395-03
footprint MY_FE03
footprint MY_FE03W
footprint MY_MA03-1W
footprint MY_ECH381H_03P
pins: 1, 2, 3

## Header 3X2
designator P?  (value not drawn)
Header, 6-Pin, Dual row; ASiD Part Number: Header 3X2-AS
footprint MY_2x03
footprint MY_2X03_BOX
footprint MY_ML6L
footprint MY_FE03-2
footprint MY_FE03-2W
footprint MY_MA03-2W
pins: 1, 2, 3, 4, 5, 6

## Header 4
designator P?  (value not drawn)
Header, 4-Pin; ASiD Part Number: Header 4-AS
footprint My_1X04
signal-integrity model Connector
footprint MY_MSTBA4
footprint MY_FPC4_1mm
footprint MY_6410-04
footprint MY_7395-04
footprint MY_FE04
footprint MY_FE04W
footprint MY_MA04-1W
pins: 1, 2, 3, 4

## Header 4X2
designator P?  (value not drawn)
Header, 8-Pin, Dual row; ASiD Part Number: Header 4X2-AS
footprint MY_FE04-2W
footprint MY_MA04-2W
footprint My_2X4 (Footprint not found)
footprint MY_FE04-2
pins: 1, 2, 3, 4, 5, 6, 7, 8

## Header 5
designator P?  (value not drawn)
Header, 5-Pin; ASiD Part Number: Header 5-AS
footprint My_1X05
signal-integrity model Connector
footprint MY_MSTBA5
footprint MY_1x05_SMD
footprint MY_6410-05
footprint MY_7395-05
footprint MY_FE05
footprint MY_FE05W
footprint MY_MA05-1W
footprint MY_ECH381H_05P
pins: 1, 2, 3, 4, 5

## Header 5X2
designator P?  (value not drawn)
Header, 10-Pin, Dual row; ASiD Part Number: Header 5X2-AS
footprint MY_2x05
footprint MY_2X05_BOX
footprint MY_ML10L
footprint MY_FE05-2
footprint MY_FE05-2W
footprint MY_MA05-2W
footprint MY_87831-1020
pins: 1, 2, 3, 4, 5, 6, 7, 8, 9, 10

## Header 6
designator P?  (value not drawn)
Header, 6-Pin; ASiD Part Number: Header 6-AS
footprint My_1X06
signal-integrity model Connector
footprint MY_53253-0670
footprint MY_FE06
footprint MY_FE06W
footprint MY_MA06-1W
pins: 1, 2, 3, 4, 5, 6

## Header 6X2
designator P?  (value not drawn)
Header, 12-Pin, Dual row; ASiD Part Number: Header 6X2-AS
footprint My_2X06
signal-integrity model Connector
footprint MY_FE06-2
footprint MY_FE06-2W
footprint MY_MA06-2W
pins: 1, 2, 3, 4, 5, 6, 7, 8, 9, 10, 11, 12

## Header 7
designator P?  (value not drawn)
Header, 8-Pin, Dual row; ASiD Part Number: Header 7-AS
signal-integrity model Connector
footprint My_1X07
footprint MY_FE07
footprint MY_FE07W
footprint MY_MA07-1W
footprint My_1X07_FPC
pins: 1, 2, 3, 4, 5, 6, 7

## Header 7X2
designator P?  (value not drawn)
Header, 14-Pin, Dual row; ASiD Part Number: Header 7X2-AS
signal-integrity model Connector
footprint MY_FE07-2W
footprint MY_MA07-2W
footprint My_2X07
footprint MY_FE07-2
pins: 1, 2, 3, 4, 5, 6, 7, 8, 9, 10, 11, 12, 13, 14

## Header 8
designator P?  (value not drawn)
Header, 8-Pin, Dual row; ASiD Part Number: Header 8-AS
signal-integrity model Connector
footprint MY_1X08
footprint MY_FE08
footprint MY_FE08W
footprint MY_MA08-1W
pins: 1, 2, 3, 4, 5, 6, 7, 8

## Header 8X2
designator P?  (value not drawn)
Header, 16-Pin, Dual row; ASiD Part Number: Header 8X2-AS
footprint My_2X08
signal-integrity model Connector
footprint MY_2X08_BOX
footprint MY_ML16L
footprint MY_FE08-2
footprint MY_MA08-2W
footprint MY_FE08-2W
pins: 1, 2, 3, 4, 5, 6, 7, 8, 9, 10, 11, 12, 13, 14, 15, 16

## Header 9
designator P?  (value not drawn)
Header, 9-Pin; ASiD Part Number: Header 9-AS
signal-integrity model Connector
footprint MY_FE09
footprint MY_FE09W
footprint MY_MA09-1W
footprint MY_MA09-1
pins: 1, 2, 3, 4, 5, 6, 7, 8, 9

## Header 9X2
designator P?  (value not drawn)
Header, 18-Pin, Dual row; ASiD Part Number: Header 9X2-AS
signal-integrity model Connector
footprint MY_FE09-2W
footprint MY_MA09-2W
footprint My_2X09
footprint MY_FE09-2
pins: 1, 2, 3, 4, 5, 6, 7, 8, 9, 10, 11, 12, 13, 14, 15, 16, 17, 18

## Header 10
designator P?  (value not drawn)
Header, 10-Pin; ASiD Part Number: Header 10-AS
signal-integrity model Connector
footprint MY_53253-1070
footprint MY_FE10
footprint MY_FE10W
footprint MY_MA10-1
footprint MY_MA10-1W
pins: 1, 2, 3, 4, 5, 6, 7, 8, 9, 10

## Header 10X2
designator P?  (value not drawn)
Header, 20-Pin, Dual row; ASiD Part Number: Header 10X2-AS
footprint My_2X10
signal-integrity model Connector
footprint My_2X10_BOX
footprint MY_ML20L
footprint MY_2X10_BOX_2mm
footprint MY_FE10-2
footprint MY_FE10-2W
footprint MY_MA10-2W
pins: 1, 2, 3, 4, 5, 6, 7, 8, 9, 10, 11, 12, 13, 14, 15, 16, 17, 18, 19, 20
